# Altium footprint library con-amp.PCBLIB: 295 footprints (part 5 of 19) (continued)
## 382784-1 [mil] (continued)

## 382813-1 [mil]
pads (406):
  round 62 hole 62: 1(-2900,-150) 1(-2900,150)
  rect 48x48 hole 32: 1(-2575,-187.5)
  round 93 hole 93: 1(0,-150) 1(0,150) 1(2900,-150) 1(2900,150)
  oct 48x48 hole 32: 2(-2525,-262.5) 3(-2475,-187.5) 4(-2425,-262.5) 5(-2375,-187.5) 6(-2325,-262.5) 7(-2275,-187.5) 8(-2225,-262.5) 9(-2175,-187.5) 10(-2125,-262.5) 11(-2075,-187.5) 12(-2025,-262.5) 13(-1975,-187.5) 14(-1925,-262.5) 15(-1875,-187.5) 16(-1825,-262.5) 17(-1775,-187.5) 18(-1725,-262.5) 19(-1675,-187.5) 20(-1625,-262.5) 21(-1575,-187.5) 22(-1525,-262.5) 23(-1475,-187.5) 24(-1425,-262.5) 25(-1375,-187.5) 26(-1325,-262.5) 27(-1275,-187.5) 28(-1225,-262.5) 29(-1175,-187.5) 30(-1125,-262.5) 31(-1075,-187.5) 32(-1025,-262.5) 33(-975,-187.5) 34(-925,-262.5) 35(-875,-187.5) 36(-825,-262.5) 37(-775,-187.5) 38(-725,-262.5) 39(-675,-187.5) 40(-625,-262.5) 41(-575,-187.5) 42(-525,-262.5) 43(-475,-187.5) 44(-425,-262.5) 45(-375,-187.5) 46(-325,-262.5) 47(-275,-187.5) 48(-225,-262.5) 49(-175,-187.5) 50(-125,-262.5) 51(125,-187.5) 52(175,-262.5) 53(225,-187.5) 54(275,-262.5) 55(325,-187.5) 56(375,-262.5) 57(425,-187.5) 58(475,-262.5) 59(525,-187.5) 60(575,-262.5) 61(625,-187.5) 62(675,-262.5) 63(725,-187.5) 64(775,-262.5) 65(825,-187.5) 66(875,-262.5) 67(925,-187.5) 68(975,-262.5) 69(1025,-187.5) 70(1075,-262.5) 71(1125,-187.5) 72(1175,-262.5) 73(1225,-187.5) 74(1275,-262.5) 75(1325,-187.5) 76(1375,-262.5) 77(1425,-187.5) 78(1475,-262.5) 79(1525,-187.5) 80(1575,-262.5) 81(1625,-187.5) 82(1675,-262.5) 83(1725,-187.5) 84(1775,-262.5) 85(1825,-187.5) 86(1875,-262.5) 87(1925,-187.5) 88(1975,-262.5) 89(2025,-187.5) 90(2075,-262.5) 91(2125,-187.5) 92(2175,-262.5) 93(2225,-187.5) 94(2275,-262.5) 95(2325,-187.5) 96(2375,-262.5) 97(2425,-187.5) 98(2475,-262.5) 99(2525,-187.5) 100(2575,-262.5) 101(-2575,-37.5) 102(-2525,-112.5) 103(-2475,-37.5) 104(-2425,-112.5) 105(-2375,-37.5) 106(-2325,-112.5) 107(-2275,-37.5) 108(-2225,-112.5) 109(-2175,-37.5) 110(-2125,-112.5) 111(-2075,-37.5) 112(-2025,-112.5) 113(-1975,-37.5) 114(-1925,-112.5) 115(-1875,-37.5) 116(-1825,-112.5) 117(-1775,-37.5) 118(-1725,-112.5) 119(-1675,-37.5) 120(-1625,-112.5) 121(-1575,-37.5) 122(-1525,-112.5) 123(-1475,-37.5) 124(-1425,-112.5) 125(-1375,-37.5) 126(-1325,-112.5) 127(-1275,-37.5) 128(-1225,-112.5) 129(-1175,-37.5) 130(-1125,-112.5) 131(-1075,-37.5) 132(-1025,-112.5) 133(-975,-37.5) 134(-925,-112.5) 135(-875,-37.5) 136(-825,-112.5) 137(-775,-37.5) 138(-725,-112.5) 139(-675,-37.5) 140(-625,-112.5) 141(-575,-37.5) 142(-525,-112.5) 143(-475,-37.5) 144(-425,-112.5) 145(-375,-37.5) 146(-325,-112.5) 147(-275,-37.5) 148(-225,-112.5) 149(-175,-37.5) 150(-125,-112.5) 151(125,-37.5) 152(175,-112.5) 153(225,-37.5) 154(275,-112.5) 155(325,-37.5) 156(375,-112.5) 157(425,-37.5) 158(475,-112.5) 159(525,-37.5) 160(575,-112.5) 161(625,-37.5) 162(675,-112.5) 163(725,-37.5) 164(775,-112.5) 165(825,-37.5) 166(875,-112.5) 167(925,-37.5) 168(975,-112.5) 169(1025,-37.5) 170(1075,-112.5) 171(1125,-37.5) 172(1175,-112.5) 173(1225,-37.5) 174(1275,-112.5) 175(1325,-37.5) 176(1375,-112.5) 177(1425,-37.5) 178(1475,-112.5) 179(1525,-37.5) 180(1575,-112.5) 181(1625,-37.5) 182(1675,-112.5) 183(1725,-37.5) 184(1775,-112.5) 185(1825,-37.5) 186(1875,-112.5) 187(1925,-37.5) 188(1975,-112.5) 189(2025,-37.5) 190(2075,-112.5) 191(2125,-37.5) 192(2175,-112.5) 193(2225,-37.5) 194(2275,-112.5) 195(2325,-37.5) 196(2375,-112.5) 197(2425,-37.5) 198(2475,-112.5) 199(2525,-37.5) 200(2575,-112.5) 201(-2575,112.5) 202(-2525,37.5) 203(-2475,112.5) 204(-2425,37.5) 205(-2375,112.5) 206(-2325,37.5) 207(-2275,112.5) 208(-2225,37.5) 209(-2175,112.5) 210(-2125,37.5) 211(-2075,112.5) 212(-2025,37.5) 213(-1975,112.5) 214(-1925,37.5) 215(-1875,112.5) 216(-1825,37.5) 217(-1775,112.5) 218(-1725,37.5) 219(-1675,112.5) 220(-1625,37.5) 221(-1575,112.5) 222(-1525,37.5) 223(-1475,112.5) 224(-1425,37.5) 225(-1375,112.5) 226(-1325,37.5) 227(-1275,112.5) 228(-1225,37.5) 229(-1175,112.5) 230(-1125,37.5) 231(-1075,112.5) 232(-1025,37.5) 233(-975,112.5) 234(-925,37.5) 235(-875,112.5) 236(-825,37.5) 237(-775,112.5) 238(-725,37.5) 239(-675,112.5) 240(-625,37.5) 241(-575,112.5) 242(-525,37.5) 243(-475,112.5) 244(-425,37.5) 245(-375,112.5) 246(-325,37.5) 247(-275,112.5) 248(-225,37.5) 249(-175,112.5) 250(-125,37.5) 251(125,112.5) 252(175,37.5) 253(225,112.5) 254(275,37.5) 255(325,112.5) 256(375,37.5) 257(425,112.5) 258(475,37.5) 259(525,112.5) 260(575,37.5) 261(625,112.5) 262(675,37.5) 263(725,112.5) 264(775,37.5) 265(825,112.5) 266(875,37.5) 267(925,112.5) 268(975,37.5) 269(1025,112.5) 270(1075,37.5) 271(1125,112.5) 272(1175,37.5) 273(1225,112.5) 274(1275,37.5) 275(1325,112.5) 276(1375,37.5) 277(1425,112.5) 278(1475,37.5) 279(1525,112.5) 280(1575,37.5) 281(1625,112.5) 282(1675,37.5) 283(1725,112.5) 284(1775,37.5) 285(1825,112.5) 286(1875,37.5) 287(1925,112.5) 288(1975,37.5) 289(2025,112.5) 290(2075,37.5) 291(2125,112.5) 292(2175,37.5) 293(2225,112.5) 294(2275,37.5) 295(2325,112.5) 296(2375,37.5) 297(2425,112.5) 298(2475,37.5) 299(2525,112.5) 300(2575,37.5) 301(-2575,262.5) 302(-2525,187.5) 303(-2475,262.5) 304(-2425,187.5) 305(-2375,262.5) 306(-2325,187.5) 307(-2275,262.5) 308(-2225,187.5) 309(-2175,262.5) 310(-2125,187.5) 311(-2075,262.5) 312(-2025,187.5) 313(-1975,262.5) 314(-1925,187.5) 315(-1875,262.5) 316(-1825,187.5) 317(-1775,262.5) 318(-1725,187.5) 319(-1675,262.5) 320(-1625,187.5) 321(-1575,262.5) 322(-1525,187.5) 323(-1475,262.5) 324(-1425,187.5) 325(-1375,262.5) 326(-1325,187.5) 327(-1275,262.5) 328(-1225,187.5) 329(-1175,262.5) 330(-1125,187.5) 331(-1075,262.5) 332(-1025,187.5) 333(-975,262.5) 334(-925,187.5) 335(-875,262.5) 336(-825,187.5) 337(-775,262.5) 338(-725,187.5) 339(-675,262.5) 340(-625,187.5) 341(-575,262.5) 342(-525,187.5) 343(-475,262.5) 344(-425,187.5) 345(-375,262.5) 346(-325,187.5) 347(-275,262.5) 348(-225,187.5) 349(-175,262.5) 350(-125,187.5) 351(125,262.5) 352(175,187.5) 353(225,262.5) 354(275,187.5) 355(325,262.5) 356(375,187.5) 357(425,262.5) 358(475,187.5) 359(525,262.5) 360(575,187.5) 361(625,262.5) 362(675,187.5) 363(725,262.5) 364(775,187.5) 365(825,262.5) 366(875,187.5) 367(925,262.5) 368(975,187.5) 369(1025,262.5) 370(1075,187.5) 371(1125,262.5) 372(1175,187.5) 373(1225,262.5) 374(1275,187.5) 375(1325,262.5) 376(1375,187.5) 377(1425,262.5) 378(1475,187.5) 379(1525,262.5) 380(1575,187.5) 381(1625,262.5) 382(1675,187.5) 383(1725,262.5) 384(1775,187.5) 385(1825,262.5) 386(1875,187.5) 387(1925,262.5) 388(1975,187.5) 389(2025,262.5) 390(2075,187.5) 391(2125,262.5) 392(2175,187.5) 393(2225,262.5) 394(2275,187.5) 395(2325,262.5) 396(2375,187.5) 397(2425,262.5) 398(2475,187.5) 399(2525,262.5) 400(2575,187.5)
Top Overlay:
  lines w10: -2965,230 -2870,230 ; -2870,-300 -2870,-50 ; -2870,-5 -2870,-50 ; -2870,0 -2870,50 ; -2870,295 -2870,230 ; -2792,-300 -2792,-185 -2670,-185 ; -2792,2 -2792,0 ; -2792,302 -2792,185 ; -2670,-115 -2792,-115 -2792,0 ; -2670,115 -2792,115 ; -2670,185 -2792,185 ; -2667,-300 -2667,-185 ; -2667,-115 -2667,0 ; -2667,2 -2667,0 ; -2667,115 -2667,0 ; -2667,185 -2667,302 ; 2667,-300 2667,-185 ; 2667,-115 2667,0 ; 2667,2 2667,0 ; 2667,115 2667,0 ; 2667,185 2667,302 ; 2670,-185 2792,-185 ; 2670,-115 2792,-115 ; 2670,115 2792,115 ; 2670,185 2792,185 ; 2792,-300 2792,-185 ; 2792,-70 2792,-115 ; 2792,70 2792,115 ; 2792,302 2792,185 ; 2890,-20 2890,-40 2875,-40 2875,50 2910,50 cw(c2910,17.5) 2910,-15 2890,-15 ; 2970,-185 2837,-185 2837,-115 2970,-115 ; 2970,115 2837,115 2837,185 2970,185 ; -2870,-50 -2970,-50 -3115,-50 -3115,50 -2970,50 -2870,50 ; -2870,50 -2870,230 ; -2792,0 -2792,115 ; -2792,115 -2792,185 ; 2792,-185 2792,-115 ; 2792,115 2792,185 ; -75,-225 -75,-75 cw(c-50,-75) -50,-50 50,-50 cw(c50,-75) 75,-75 75,-225 cw(c50,-225) 50,-250 -50,-250 cw(c-50,-225) -75,-225 ; -75,75 -75,225 cw(c-50,225) -50,250 50,250 cw(c50,225) 75,225 75,75 cw(c50,75) 50,50 -50,50 cw(c-50,75) -75,75 ; -55,-165 -55,-135 -15,-135 -15,-95 15,-95 15,-135 55,-135 55,-165 15,-165 15,-205 -15,-205 -15,-165 -55,-165 ; -55,135 -55,165 -15,165 -15,205 15,205 15,165 55,165 55,135 15,135 15,95 -15,95 -15,135 -55,135 ; 2685,-40 2715,50 2735,50 2765,-40 2750,-40 2735,0 2715,0 2700,-40 2685,-40 ; 2720,15 2725,30 2730,15 2720,15 ; 2780,-40 2780,50 2795,50 2815,30 2835,50 2850,50 2850,-40 2835,-40 2835,25 2815,5 2795,25 2795,-40 2780,-40 ; 2890,5 2910,5 ccw(c2910,17.5) 2910,30 2890,30 2890,5
  lines w12: -2970,-303 2970,-303 2970,-230 ; -2970,-300 -2970,-50 ; -2970,50 -2970,305 2970,305 2970,230 ; 2795,-230 2970,-230 ; 2795,-70 2970,-70 ; 2795,70 2970,70 ; 2795,230 2970,230 ; 2970,-230 2970,-185 2970,-115 2970,-70 ; 2970,-70 2970,70 ; 2970,70 2970,115 2970,185 2970,230
Mechanical 16:
  lines w10: -2665,-185 -75,-185 ; -2665,-115 -75,-115 ; -2665,115 -75,115 ; -2665,185 -75,185 ; 75,-185 2665,-185 ; 75,-115 2665,-115 ; 75,115 2665,115 ; 75,185 2665,185

## 382824-1 [mil]
pads (170):
  round 80 hole 80: 1(-2400,0) 1(2400,0)
  rect 48x48 hole 32: 1(-2275,-37.5) 85(-2275,112.5)
  oct 48x48 hole 32: 2(-2225,-112.5) 3(-2175,-37.5) 4(-2125,-112.5) 5(-2075,-37.5) 6(-2025,-112.5) 7(-1975,-37.5) 8(-1925,-112.5) 9(-1875,-37.5) 10(-1825,-112.5) 11(-1575,-37.5) 12(-1525,-112.5) 13(-1475,-37.5) 14(-1425,-112.5) 15(-1375,-37.5) 16(-1325,-112.5) 17(-1275,-37.5) 18(-1225,-112.5) 19(-1175,-37.5) 20(-1125,-112.5) 21(-1075,-37.5) 22(-1025,-112.5) 23(-975,-37.5) 24(-925,-112.5) 25(-875,-37.5) 26(-825,-112.5) 27(-775,-37.5) 28(-725,-112.5) 29(-675,-37.5) 30(-625,-112.5) 31(-575,-37.5) 32(-525,-112.5) 33(-475,-37.5) 34(-425,-112.5) 35(-375,-37.5) 36(-325,-112.5) 37(-275,-37.5) 38(-225,-112.5) 39(-175,-37.5) 40(-125,-112.5) 41(125,-37.5) 42(175,-112.5) 43(225,-37.5) 44(275,-112.5) 45(325,-37.5) 46(375,-112.5) 47(425,-37.5) 48(475,-112.5) 49(525,-37.5) 50(575,-112.5) 51(625,-37.5) 52(675,-112.5) 53(725,-37.5) 54(775,-112.5) 55(825,-37.5) 56(875,-112.5) 57(925,-37.5) 58(975,-112.5) 59(1025,-37.5) 60(1075,-112.5) 61(1125,-37.5) 62(1175,-112.5) 63(1225,-37.5) 64(1275,-112.5) 65(1325,-37.5) 66(1375,-112.5) 67(1425,-37.5) 68(1475,-112.5) 69(1525,-37.5) 70(1575,-112.5) 71(1625,-37.5) 72(1675,-112.5) 73(1725,-37.5) 74(1775,-112.5) 75(1825,-37.5) 76(1875,-112.5) 77(1925,-37.5) 78(1975,-112.5) 79(2025,-37.5) 80(2075,-112.5) 81(2125,-37.5) 82(2175,-112.5) 83(2225,-37.5) 84(2275,-112.5) 86(-2225,37.5) 87(-2175,112.5) 88(-2125,37.5) 89(-2075,112.5) 90(-2025,37.5) 91(-1975,112.5) 92(-1925,37.5) 93(-1875,112.5) 94(-1825,37.5) 95(-1575,112.5) 96(-1525,37.5) 97(-1475,112.5) 98(-1425,37.5) 99(-1375,112.5) 100(-1325,37.5) 101(-1275,112.5) 102(-1225,37.5) 103(-1175,112.5) 104(-1125,37.5) 105(-1075,112.5) 106(-1025,37.5) 107(-975,112.5) 108(-925,37.5) 109(-875,112.5) 110(-825,37.5) 111(-775,112.5) 112(-725,37.5) 113(-675,112.5) 114(-625,37.5) 115(-575,112.5) 116(-525,37.5) 117(-475,112.5) 118(-425,37.5) 119(-375,112.5) 120(-325,37.5) 121(-275,112.5) 122(-225,37.5) 123(-175,112.5) 124(-125,37.5) 125(125,112.5) 126(175,37.5) 127(225,112.5) 128(275,37.5) 129(325,112.5) 130(375,37.5) 131(425,112.5) 132(475,37.5) 133(525,112.5) 134(575,37.5) 135(625,112.5) 136(675,37.5) 137(725,112.5) 138(775,37.5) 139(825,112.5) 140(875,37.5) 141(925,112.5) 142(975,37.5) 143(1025,112.5) 144(1075,37.5) 145(1125,112.5) 146(1175,37.5) 147(1225,112.5) 148(1275,37.5) 149(1325,112.5) 150(1375,37.5) 151(1425,112.5) 152(1475,37.5) 153(1525,112.5) 154(1575,37.5) 155(1625,112.5) 156(1675,37.5) 157(1725,112.5) 158(1775,37.5) 159(1825,112.5) 160(1875,37.5) 161(1925,112.5) 162(1975,37.5) 163(2025,112.5) 164(2075,37.5) 165(2125,112.5) 166(2175,37.5) 167(2225,112.5) 168(2275,37.5)
Top Overlay:
  lines w10: -2770,-90 -2770,-194 -2635,-194 -2635,-85 ; -2770,91 -2770,194 -2635,194 ; -2634,-194 2635,-194 ; -2635,-85 -2635,85 ; -2635,-85 -3269,-85 -3269,85 -2635,85 ; -2635,85 -2635,194 ; -2635,194 2635,194 ; -1740,-100 -1745,-100 -1745,100 -1740,100 ; -1740,-100 -1685,-100 ; -1740,-100 cw(c-1740,-75) -1765,-75 -1765,75 cw(c-1740,75) -1740,100 ; -1740,100 -1685,100 ; -1685,-100 -1640,-100 ccw(c-1640,-75) -1615,-75 -1615,75 ccw(c-1640,75) -1640,100 -1685,100 ; -1685,-100 -1685,100 ; -35,-100 -35,100 ; -35,-100 -50,-100 cw(c-50,-75) -75,-75 -75,75 cw(c-50,75) -50,100 -35,100 ; -35,-100 35,-100 ; -35,100 35,100 ; 35,-100 50,-100 ccw(c50,-75) 75,-75 75,75 ccw(c50,75) 50,100 35,100 ; 35,-100 35,100 ; 2635,-194 2635,-85 ; 2635,-194 2770,-194 2770,-85 ; 2635,-85 2635,85 ; 2635,-85 2770,-85 ; 2635,85 2635,194 ; 2635,85 2770,85 ; 2635,194 2770,194 2770,85 ; 2770,-85 3269,-85 3269,85 2770,85
Mechanical 16:
  lines w10: -2631,-34 2630,-34 ; -2631,34 2630,34

## 382824-4 [mil]
pads (170):
  round 80 hole 80: 1(-2400,0) 1(2400,0)
  rect 48x48 hole 32: 1(-2275,-37.5) 85(-2275,112.5)
  oct 48x48 hole 32: 2(-2225,-112.5) 3(-2175,-37.5) 4(-2125,-112.5) 5(-2075,-37.5) 6(-2025,-112.5) 7(-1975,-37.5) 8(-1925,-112.5) 9(-1875,-37.5) 10(-1825,-112.5) 11(-1575,-37.5) 12(-1525,-112.5) 13(-1475,-37.5) 14(-1425,-112.5) 15(-1375,-37.5) 16(-1325,-112.5) 17(-1275,-37.5) 18(-1225,-112.5) 19(-1175,-37.5) 20(-1125,-112.5) 21(-1075,-37.5) 22(-1025,-112.5) 23(-975,-37.5) 24(-925,-112.5) 25(-875,-37.5) 26(-825,-112.5) 27(-775,-37.5) 28(-725,-112.5) 29(-675,-37.5) 30(-625,-112.5) 31(-575,-37.5) 32(-525,-112.5) 33(-475,-37.5) 34(-425,-112.5) 35(-375,-37.5) 36(-325,-112.5) 37(-275,-37.5) 38(-225,-112.5) 39(-175,-37.5) 40(-125,-112.5) 41(125,-37.5) 42(175,-112.5) 43(225,-37.5) 44(275,-112.5) 45(325,-37.5) 46(375,-112.5) 47(425,-37.5) 48(475,-112.5) 49(525,-37.5) 50(575,-112.5) 51(625,-37.5) 52(675,-112.5) 53(725,-37.5) 54(775,-112.5) 55(825,-37.5) 56(875,-112.5) 57(925,-37.5) 58(975,-112.5) 59(1025,-37.5) 60(1075,-112.5) 61(1125,-37.5) 62(1175,-112.5) 63(1225,-37.5) 64(1275,-112.5) 65(1325,-37.5) 66(1375,-112.5) 67(1425,-37.5) 68(1475,-112.5) 69(1525,-37.5) 70(1575,-112.5) 71(1625,-37.5) 72(1675,-112.5) 73(1725,-37.5) 74(1775,-112.5) 75(1825,-37.5) 76(1875,-112.5) 77(1925,-37.5) 78(1975,-112.5) 79(2025,-37.5) 80(2075,-112.5) 81(2125,-37.5) 82(2175,-112.5) 83(2225,-37.5) 84(2275,-112.5) 86(-2225,37.5) 87(-2175,112.5) 88(-2125,37.5) 89(-2075,112.5) 90(-2025,37.5) 91(-1975,112.5) 92(-1925,37.5) 93(-1875,112.5) 94(-1825,37.5) 95(-1575,112.5) 96(-1525,37.5) 97(-1475,112.5) 98(-1425,37.5) 99(-1375,112.5) 100(-1325,37.5) 101(-1275,112.5) 102(-1225,37.5) 103(-1175,112.5) 104(-1125,37.5) 105(-1075,112.5) 106(-1025,37.5) 107(-975,112.5) 108(-925,37.5) 109(-875,112.5) 110(-825,37.5) 111(-775,112.5) 112(-725,37.5) 113(-675,112.5) 114(-625,37.5) 115(-575,112.5) 116(-525,37.5) 117(-475,112.5) 118(-425,37.5) 119(-375,112.5) 120(-325,37.5) 121(-275,112.5) 122(-225,37.5) 123(-175,112.5) 124(-125,37.5) 125(125,112.5) 126(175,37.5) 127(225,112.5) 128(275,37.5) 129(325,112.5) 130(375,37.5) 131(425,112.5) 132(475,37.5) 133(525,112.5) 134(575,37.5) 135(625,112.5) 136(675,37.5) 137(725,112.5) 138(775,37.5) 139(825,112.5) 140(875,37.5) 141(925,112.5) 142(975,37.5) 143(1025,112.5) 144(1075,37.5) 145(1125,112.5) 146(1175,37.5) 147(1225,112.5) 148(1275,37.5) 149(1325,112.5) 150(1375,37.5) 151(1425,112.5) 152(1475,37.5) 153(1525,112.5) 154(1575,37.5) 155(1625,112.5) 156(1675,37.5) 157(1725,112.5) 158(1775,37.5) 159(1825,112.5) 160(1875,37.5) 161(1925,112.5) 162(1975,37.5) 163(2025,112.5) 164(2075,37.5) 165(2125,112.5) 166(2175,37.5) 167(2225,112.5) 168(2275,37.5)
Top Overlay:
  lines w10: -2770,-90 -2770,-194 -2635,-194 -2635,-85 ; -2770,91 -2770,194 -2635,194 ; -2634,-194 2635,-194 ; -1765,-35 -1765,-75 ccw(c-1740,-75) -1740,-100 -1730,-100 ; -1765,35 -1765,75 cw(c-1740,75) -1740,100 -1730,100 ; -1615,-35 -1615,-75 cw(c-1640,-75) -1640,-100 -1650,-100 ; -1615,35 -1615,75 ccw(c-1640,75) -1640,100 -1650,100 ; -75,-35 -75,-75 ccw(c-50,-75) -50,-100 -35,-100 ; -75,35 -75,75 cw(c-50,75) -50,100 -35,100 ; 75,-35 75,-75 cw(c50,-75) 50,-100 35,-100 ; 75,35 75,75 ccw(c50,75) 50,100 35,100 ; -2635,-85 -2635,85 ; -2635,-85 -3269,-85 -3269,85 -2635,85 ; -2635,85 -2635,194 ; -2635,194 2635,194 ; -1730,-100 -1730,100 ; -1730,-100 -1650,-100 ; -1730,100 -1650,100 ; -1650,-100 -1650,100 ; -35,-100 -35,100 ; -35,-100 35,-100 ; -35,100 35,100 ; 35,-100 35,100 ; 2635,-194 2635,-85 ; 2635,-194 2770,-194 2770,-85 ; 2635,-85 2635,85 ; 2635,-85 2770,-85 ; 2635,85 2635,194 ; 2635,85 2770,85 ; 2635,194 2770,194 2770,85 ; 2770,-85 3269,-85 3269,85 2770,85
  text "1" at -2325,-150 h108.5
Mechanical 16:
  lines w10: -2631,-34 2630,-34 ; -2631,34 2630,34

## 382830-1 [mil]
pads (172):
  round 80 hole 80: 1(-2400,0) 1(2400,0)
  rect 48x48 hole 32: 1(-2275,-37.5) 85(-2275,112.5)
  round 93 hole 93: 1(-1700,0) 1(0,0)
  oct 48x48 hole 32: 2(-2225,-112.5) 3(-2175,-37.5) 4(-2125,-112.5) 5(-2075,-37.5) 6(-2025,-112.5) 7(-1975,-37.5) 8(-1925,-112.5) 9(-1875,-37.5) 10(-1825,-112.5) 11(-1575,-37.5) 12(-1525,-112.5) 13(-1475,-37.5) 14(-1425,-112.5) 15(-1375,-37.5) 16(-1325,-112.5) 17(-1275,-37.5) 18(-1225,-112.5) 19(-1175,-37.5) 20(-1125,-112.5) 21(-1075,-37.5) 22(-1025,-112.5) 23(-975,-37.5) 24(-925,-112.5) 25(-875,-37.5) 26(-825,-112.5) 27(-775,-37.5) 28(-725,-112.5) 29(-675,-37.5) 30(-625,-112.5) 31(-575,-37.5) 32(-525,-112.5) 33(-475,-37.5) 34(-425,-112.5) 35(-375,-37.5) 36(-325,-112.5) 37(-275,-37.5) 38(-225,-112.5) 39(-175,-37.5) 40(-125,-112.5) 41(125,-37.5) 42(175,-112.5) 43(225,-37.5) 44(275,-112.5) 45(325,-37.5) 46(375,-112.5) 47(425,-37.5) 48(475,-112.5) 49(525,-37.5) 50(575,-112.5) 51(625,-37.5) 52(675,-112.5) 53(725,-37.5) 54(775,-112.5) 55(825,-37.5) 56(875,-112.5) 57(925,-37.5) 58(975,-112.5) 59(1025,-37.5) 60(1075,-112.5) 61(1125,-37.5) 62(1175,-112.5) 63(1225,-37.5) 64(1275,-112.5) 65(1325,-37.5) 66(1375,-112.5) 67(1425,-37.5) 68(1475,-112.5) 69(1525,-37.5) 70(1575,-112.5) 71(1625,-37.5) 72(1675,-112.5) 73(1725,-37.5) 74(1775,-112.5) 75(1825,-37.5) 76(1875,-112.5) 77(1925,-37.5) 78(1975,-112.5) 79(2025,-37.5) 80(2075,-112.5) 81(2125,-37.5) 82(2175,-112.5) 83(2225,-37.5) 84(2275,-112.5) 86(-2225,37.5) 87(-2175,112.5) 88(-2125,37.5) 89(-2075,112.5) 90(-2025,37.5) 91(-1975,112.5) 92(-1925,37.5) 93(-1875,112.5) 94(-1825,37.5) 95(-1575,112.5) 96(-1525,37.5) 97(-1475,112.5) 98(-1425,37.5) 99(-1375,112.5) 100(-1325,37.5) 101(-1275,112.5) 102(-1225,37.5) 103(-1175,112.5) 104(-1125,37.5) 105(-1075,112.5) 106(-1025,37.5) 107(-975,112.5) 108(-925,37.5) 109(-875,112.5) 110(-825,37.5) 111(-775,112.5) 112(-725,37.5) 113(-675,112.5) 114(-625,37.5) 115(-575,112.5) 116(-525,37.5) 117(-475,112.5) 118(-425,37.5) 119(-375,112.5) 120(-325,37.5) 121(-275,112.5) 122(-225,37.5) 123(-175,112.5) 124(-125,37.5) 125(125,112.5) 126(175,37.5) 127(225,112.5) 128(275,37.5) 129(325,112.5) 130(375,37.5) 131(425,112.5) 132(475,37.5) 133(525,112.5) 134(575,37.5) 135(625,112.5) 136(675,37.5) 137(725,112.5) 138(775,37.5) 139(825,112.5) 140(875,37.5) 141(925,112.5) 142(975,37.5) 143(1025,112.5) 144(1075,37.5) 145(1125,112.5) 146(1175,37.5) 147(1225,112.5) 148(1275,37.5) 149(1325,112.5) 150(1375,37.5) 151(1425,112.5) 152(1475,37.5) 153(1525,112.5) 154(1575,37.5) 155(1625,112.5) 156(1675,37.5) 157(1725,112.5) 158(1775,37.5) 159(1825,112.5) 160(1875,37.5) 161(1925,112.5) 162(1975,37.5) 163(2025,112.5) 164(2075,37.5) 165(2125,112.5) 166(2175,37.5) 167(2225,112.5) 168(2275,37.5)
Top Overlay:
  rectangle: -2940,-90 -2765,90
  rectangle: 2765,-90 2940,90
  lines w10: -2770,-90 -2770,-194 -2515,-194 -2515,-85 ; -2770,91 -2770,194 -2515,194 ; -2769,-85 -2515,-85 ; -2769,85 -2515,85 ; -2509,-194 2515,-194 ; -1775,-35 -1775,-75 ccw(c-1750,-75) -1750,-100 -1740,-100 ; -1775,35 -1775,75 cw(c-1750,75) -1750,100 -1740,100 ; -1625,-35 -1625,-75 cw(c-1650,-75) -1650,-100 -1660,-100 ; -1625,35 -1625,75 ccw(c-1650,75) -1650,100 -1660,100 ; -75,-35 -75,-75 ccw(c-50,-75) -50,-100 ; -75,35 -75,75 cw(c-50,75) -50,100 ; 75,-35 75,-75 cw(c50,-75) 50,-100 15,-100 ; 75,35 75,75 ccw(c50,75) 50,100 15,100 ; -2515,-85 -2515,85 ; -2515,85 -2515,194 ; -2515,194 2515,194 ; -1740,-100 -1740,100 ; -1740,-100 -1660,-100 ; -1740,100 -1660,100 ; -1660,-100 -1660,100 ; -50,-100 -55,-100 -55,100 -50,100 ; -50,-100 15,-100 ; -50,100 15,100 ; 15,-100 15,100 ; 2515,-194 2515,-85 ; 2515,-194 2770,-194 2770,-85 2515,-85 ; 2515,-85 2515,85 ; 2515,85 2515,194 ; 2515,85 2770,85 2770,194 2515,194
  text "1" at -2325,-150 h108.5
Mechanical 16:
  lines w10: -2511,-34 2510,-34 ; -2511,34 2510,34

## 382830-4 [mil]
pads (172):
  round 80 hole 80: 1(-2400,0) 1(2400,0)
  rect 48x48 hole 32: 1(-2275,-37.5) 85(-2275,112.5)
  round 93 hole 93: 1(-1700,0) 1(0,0)
  oct 48x48 hole 32: 2(-2225,-112.5) 3(-2175,-37.5) 4(-2125,-112.5) 5(-2075,-37.5) 6(-2025,-112.5) 7(-1975,-37.5) 8(-1925,-112.5) 9(-1875,-37.5) 10(-1825,-112.5) 11(-1575,-37.5) 12(-1525,-112.5) 13(-1475,-37.5) 14(-1425,-112.5) 15(-1375,-37.5) 16(-1325,-112.5) 17(-1275,-37.5) 18(-1225,-112.5) 19(-1175,-37.5) 20(-1125,-112.5) 21(-1075,-37.5) 22(-1025,-112.5) 23(-975,-37.5) 24(-925,-112.5) 25(-875,-37.5) 26(-825,-112.5) 27(-775,-37.5) 28(-725,-112.5) 29(-675,-37.5) 30(-625,-112.5) 31(-575,-37.5) 32(-525,-112.5) 33(-475,-37.5) 34(-425,-112.5) 35(-375,-37.5) 36(-325,-112.5) 37(-275,-37.5) 38(-225,-112.5) 39(-175,-37.5) 40(-125,-112.5) 41(125,-37.5) 42(175,-112.5) 43(225,-37.5) 44(275,-112.5) 45(325,-37.5) 46(375,-112.5) 47(425,-37.5) 48(475,-112.5) 49(525,-37.5) 50(575,-112.5) 51(625,-37.5) 52(675,-112.5) 53(725,-37.5) 54(775,-112.5) 55(825,-37.5) 56(875,-112.5) 57(925,-37.5) 58(975,-112.5) 59(1025,-37.5) 60(1075,-112.5) 61(1125,-37.5) 62(1175,-112.5) 63(1225,-37.5) 64(1275,-112.5) 65(1325,-37.5) 66(1375,-112.5) 67(1425,-37.5) 68(1475,-112.5) 69(1525,-37.5) 70(1575,-112.5) 71(1625,-37.5) 72(1675,-112.5) 73(1725,-37.5) 74(1775,-112.5) 75(1825,-37.5) 76(1875,-112.5) 77(1925,-37.5) 78(1975,-112.5) 79(2025,-37.5) 80(2075,-112.5) 81(2125,-37.5) 82(2175,-112.5) 83(2225,-37.5) 84(2275,-112.5) 86(-2225,37.5) 87(-2175,112.5) 88(-2125,37.5) 89(-2075,112.5) 90(-2025,37.5) 91(-1975,112.5) 92(-1925,37.5) 93(-1875,112.5) 94(-1825,37.5) 95(-1575,112.5) 96(-1525,37.5) 97(-1475,112.5) 98(-1425,37.5) 99(-1375,112.5) 100(-1325,37.5) 101(-1275,112.5) 102(-1225,37.5) 103(-1175,112.5) 104(-1125,37.5) 105(-1075,112.5) 106(-1025,37.5) 107(-975,112.5) 108(-925,37.5) 109(-875,112.5) 110(-825,37.5) 111(-775,112.5) 112(-725,37.5) 113(-675,112.5) 114(-625,37.5) 115(-575,112.5) 116(-525,37.5) 117(-475,112.5) 118(-425,37.5) 119(-375,112.5) 120(-325,37.5) 121(-275,112.5) 122(-225,37.5) 123(-175,112.5) 124(-125,37.5) 125(125,112.5) 126(175,37.5) 127(225,112.5) 128(275,37.5) 129(325,112.5) 130(375,37.5) 131(425,112.5) 132(475,37.5) 133(525,112.5) 134(575,37.5) 135(625,112.5) 136(675,37.5) 137(725,112.5) 138(775,37.5) 139(825,112.5) 140(875,37.5) 141(925,112.5) 142(975,37.5) 143(1025,112.5) 144(1075,37.5) 145(1125,112.5) 146(1175,37.5) 147(1225,112.5) 148(1275,37.5) 149(1325,112.5) 150(1375,37.5) 151(1425,112.5) 152(1475,37.5) 153(1525,112.5) 154(1575,37.5) 155(1625,112.5) 156(1675,37.5) 157(1725,112.5) 158(1775,37.5) 159(1825,112.5) 160(1875,37.5) 161(1925,112.5) 162(1975,37.5) 163(2025,112.5) 164(2075,37.5) 165(2125,112.5) 166(2175,37.5) 167(2225,112.5) 168(2275,37.5)
Top Overlay:
  rectangle: -2940,-90 -2765,90
  rectangle: 2765,-90 2940,90
  lines w10: -2770,-90 -2770,-194 -2515,-194 -2515,-85 ; -2770,91 -2770,194 -2515,194 ; -2769,-85 -2515,-85 ; -2769,85 -2515,85 ; -2509,-194 2515,-194 ; -1775,-35 -1775,-75 ccw(c-1750,-75) -1750,-100 -1740,-100 ; -1775,35 -1775,75 cw(c-1750,75) -1750,100 -1740,100 ; -1625,-35 -1625,-75 cw(c-1650,-75) -1650,-100 -1660,-100 ; -1625,35 -1625,75 ccw(c-1650,75) -1650,100 -1660,100 ; -75,-35 -75,-75 ccw(c-50,-75) -50,-100 -35,-100 ; -75,35 -75,75 cw(c-50,75) -50,100 -35,100 ; 75,-35 75,-75 cw(c50,-75) 50,-100 35,-100 ; 75,35 75,75 ccw(c50,75) 50,100 35,100 ; -2515,-85 -2515,85 ; -2515,85 -2515,194 ; -2515,194 2515,194 ; -1740,-100 -1740,100 ; -1740,-100 -1660,-100 ; -1740,100 -1660,100 ; -1660,-100 -1660,100 ; -35,-100 -35,100 ; -35,-100 35,-100 ; -35,100 35,100 ; 35,-100 35,100 ; 2515,-194 2515,-85 ; 2515,-194 2770,-194 2770,-85 2515,-85 ; 2515,-85 2515,85 ; 2515,85 2515,194 ; 2515,85 2770,85 2770,194 2515,194
  text "1" at -2325,-150 h108.5
Mechanical 16:
  lines w10: -2511,-34 2510,-34 ; -2511,34 2510,34